# Altium footprint library connectors_socets.pcblib: 601 footprints (part 1 of 38)
Each footprint in its own frame and in the unit in brackets; x right, y up, seen from the top. Pads: shape width x height; smd on the part's side, far side on the other; paste and mask are expansions set on the pad; w line width, h text height; cw(c..) or ccw(c..) is an arc to the next point about the centre after c.
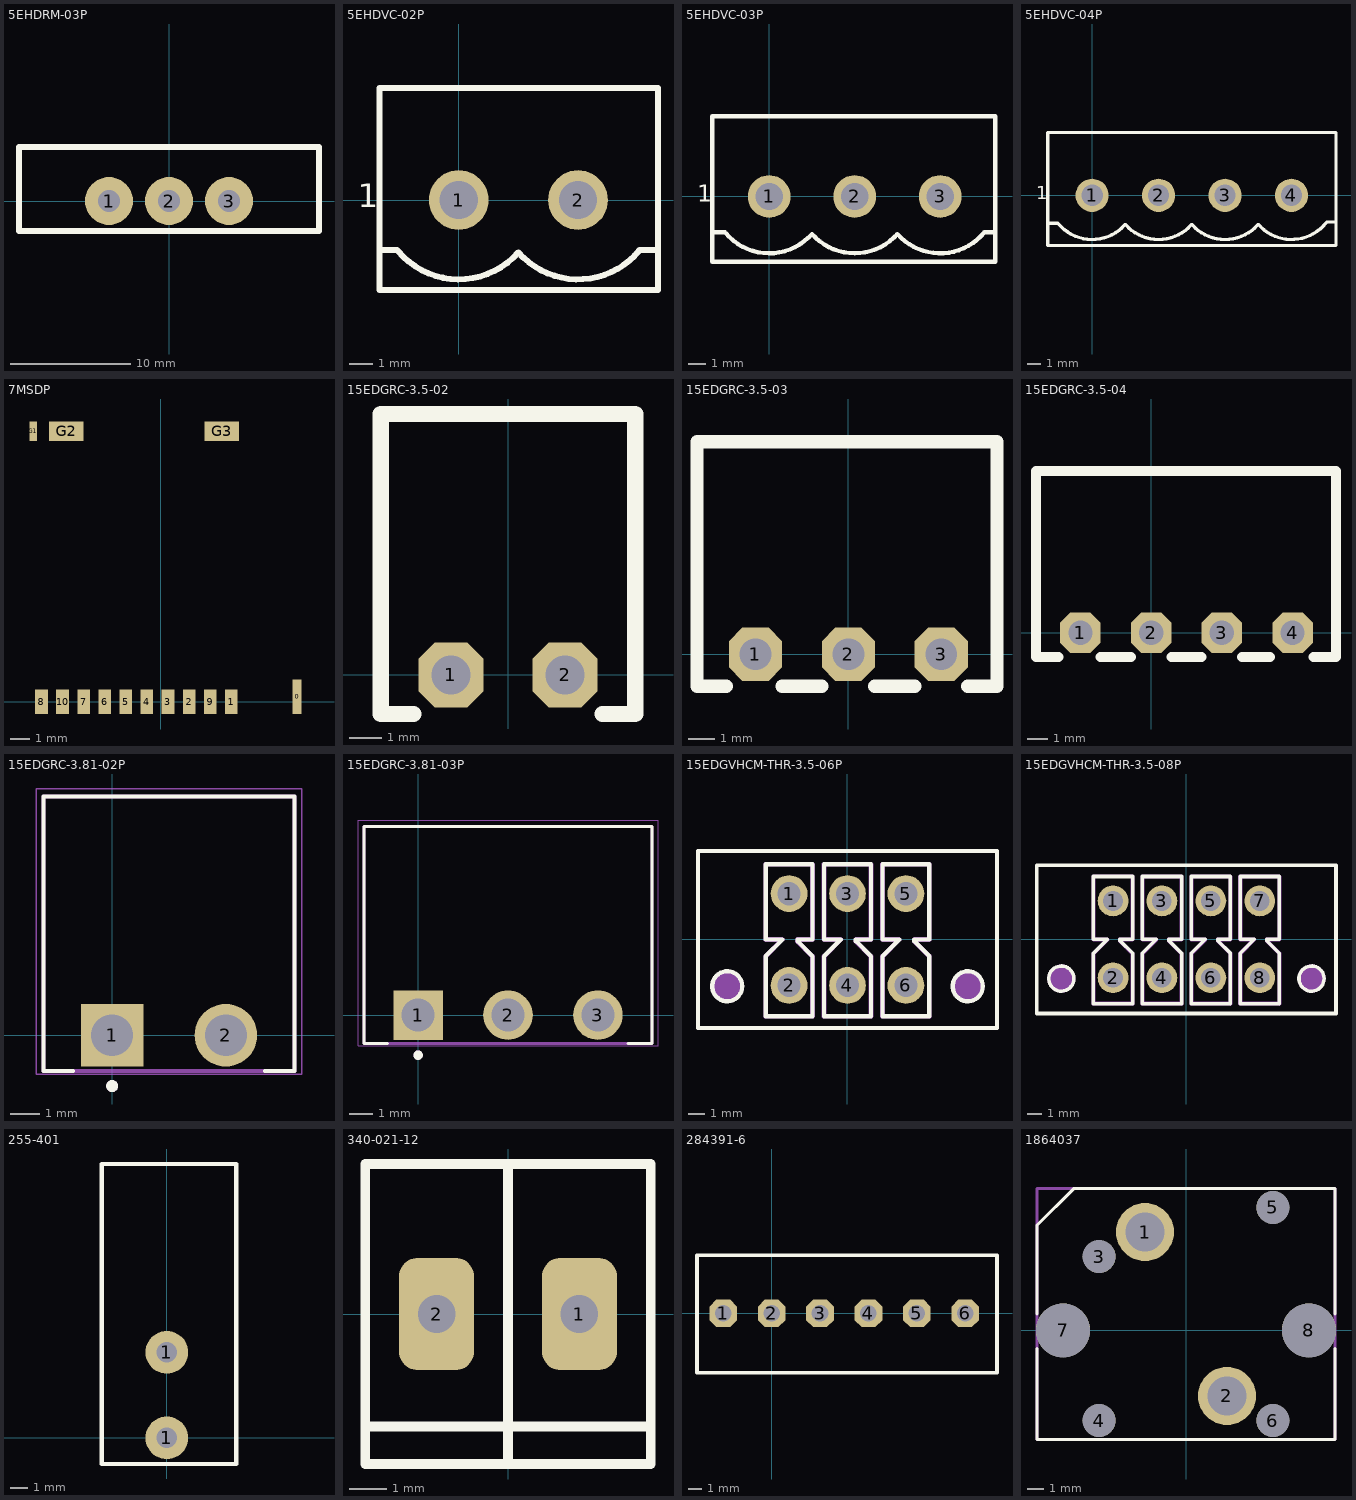
[diagram p0: the footprints below, top view; thin cyan lines are the x and y axes]

## 5EHDRM-03P [mm] "Connector 3Pin 5.00mm Pitch"
pads (3):
  round 4 hole 1.8: 1(-5,0) 2(0,0) 3(5,0)
Top Overlay:
  lines w0.5: -12.5,-2.5 0,-2.5 12.5,-2.5 12.5,3.5 12.5,4.5 -12.5,4.5 -12.5,3.5 -12.5,-2.5
3D body "terminal.stp": height 8.22, standoff -3.9, extent -12.525,-2.25 12.475,9.75

## 5EHDVC-02P [mm] "5mm 2 pins"
pads (2):
  round 2.5 hole 1.6: 1(0,0) 2(5,0)
Top Overlay:
  lines w0.254: -3.325,-2.101 -2.583,-2.101 ; -2.546,-2.139 ccw(c0,0) 2.5,-2.192 ccw(c5,0) 7.577,-2.101 8.35,-2.101 ; -3.325,-3.775 8.35,-3.775 8.35,4.7 -3.325,4.7 -3.325,-3.775
  text "1" at -4.223,-0.298 h1
3D body "5EHDVC-02P.stp": height 12.01, standoff -3.99, extent -3.3,-3.8 8.3,4.67

## 5EHDVC-03P [mm] "5mm 3 pins"
pads (3):
  round 2.5 hole 1.6: 1(0,0) 2(5,0) 3(10,0)
Top Overlay:
  lines w0.254: -3.325,-2.101 -2.583,-2.101 ; -2.546,-2.139 ccw(c0,0) 2.5,-2.192 ccw(c5,0) 7.5,-2.192 ccw(c10,0) 12.577,-2.101 13.225,-2.101 ; -3.325,-3.825 13.225,-3.825 13.225,4.7 -3.325,4.7 -3.325,-3.825
  text "1" at -4.223,-0.298 h1
3D body "5EHDVC-03P.stp": height 12.01, standoff -3.99, extent -3.325,-3.81 13.275,4.66

## 5EHDVC-04P [mm] "5mm 4 pins"
pads (4):
  round 2.5 hole 1.6: 1(0,0) 2(5,0) 3(10,0) 4(15,0)
Top Overlay:
  lines w0.254: -3.325,-2.101 -2.583,-2.101 ; -2.546,-2.139 ccw(c0,0) 2.5,-2.192 ccw(c5,0) 7.5,-2.192 ccw(c10,0) 12.5,-2.192 ccw(c15,0) 17.577,-2.101 ; 17.654,-2.011 18.302,-2.011 ; -3.325,-3.775 18.35,-3.775 18.35,4.725 -3.325,4.725 -3.325,-3.775
  text "1" at -4.223,-0.298 h1
3D body "5EHDVC-04P.stp": height 12.01, standoff -3.99, extent -3.275,-3.8 18.325,4.67

## 7MSDP [mm] "SD slot"
height 2.54
pads (14):
  rect 0.45x1.8 smd: 0(7.105,0.254)
  rect 0.66x1.27 smd: 1(3.675,0) 2(1.475,0) 3(0.375,0) 4(-0.725,0) 5(-1.825,0) 6(-2.925,0) 7(-4.025,0) 8(-6.225,0) 9(2.575,0) 10(-5.125,0)
  rect 0.4x1 smd: G1(-6.65,14.1)
  rect 1.8x1 smd: G2(-4.925,14.1) G3(3.175,14.1)
3D body "SD.stp": height 1.95, standoff 0, extent -7,-0.6 7.4,14.6

## 15EDGRC-3.5-02 [mm] "Connector 3.5mm pitch"
pads (2):
  oct 2x2 hole 1.2: 1(-1.75,0) 2(1.75,0)
Top Overlay:
  lines w0.5: -2.9,-1.2 -3.9,-1.2 -3.9,8 3.9,8 3.9,-1.2 2.9,-1.2
3D body "User Library-15EDGRC-3_5-2.step": height 7.2, standoff -3.4, extent -3.9,-1.2 3.9,8

## 15EDGRC-3.5-03 [mm] "Connector 3.5mm pitch"
pads (3):
  oct 2x2 hole 1.2: 1(-3.5,0) 2(0,0) 3(3.5,0)
Top Overlay:
  lines w0.5: -4.6,-1.2 -5.7,-1.2 -5.7,8 5.6,8 5.6,-1.2 4.5,-1.2 ; -2.5,-1.2 -1,-1.2 ; 1,-1.2 2.5,-1.2
3D body "User Library-15EDGRC-3_5-3.STEP": height 7.21, standoff -3.39, extent -5.65,-1.198 5.65,8.002

## 15EDGRC-3.5-04 [mm] "Connector 3.5mm pitch"
pads (4):
  oct 2x2 hole 1.2: 1(-3.5,0) 2(0,0) 3(3.5,0) 4(7,0)
Top Overlay:
  lines w0.5: -4.6,-1.2 -5.7,-1.2 -5.7,8 9.15,8 9.15,-1.2 8.05,-1.2 ; -2.5,-1.2 -1,-1.2 ; 1,-1.2 2.5,-1.2 ; 4.5,-1.2 5.875,-1.2
3D body "User Library-15EDGRC-3_5-3.STEP": height 2.8, standoff -7.8, extent -2.15,-1.2 9.15,8
3D body "User Library-15EDGRC-3_5-3.STEP": height 2.8, standoff -7.8, extent -5.65,-1.2 5.65,8

## 15EDGRC-3.81-02P [mm]
pads (2):
  rect 2.1x2.1 / inner round 2.1 / far side rect 2.1x2.1 hole 1.4: 1(0,0)
  round 2.1 hole 1.4: 2(3.81,0)
Top Overlay:
  circle w0.2: c0,-1.7 r0.1
  lines w0.127: -1.3,-1.2 -2.3,-1.2 -2.3,8 6.11,8 6.11,-1.2 5.11,-1.2
Plata3D:
  circle w0.2: c0,-1.7 r0.1
  lines w0.127: -2.3,-1.2 6.11,-1.2 6.11,8 -2.3,8 -2.3,-1.2
Board3D:
  lines w0.05: -2.55,-1.3 -2.55,8.25 6.36,8.25 6.36,-1.3 -2.55,-1.3
3D body "15EDGRC-3.81-02P-1Y-00A&Z(H).stp": height 7.29, standoff -3.35, extent -2.3,-1.27 6.11,7.93

## 15EDGRC-3.81-03P [mm]
pads (3):
  rect 2.1x2.1 / inner round 2.1 / far side rect 2.1x2.1 hole 1.4: 1(0,0)
  round 2.1 hole 1.4: 2(3.81,0) 3(7.62,0)
Top Overlay:
  circle w0.2: c0,-1.7 r0.1
  lines w0.127: -1.3,-1.2 -2.3,-1.2 -2.3,8 9.92,8 9.92,-1.2 ; 8.89,-1.2 9.89,-1.2
Plata3D:
  circle w0.2: c0,-1.7 r0.1
  lines w0.127: -2.3,-1.2 -2.3,8 9.92,8 9.92,-1.2 -2.3,-1.2
Board3D:
  lines w0.05: -2.55,-1.3 10.17,-1.3 10.17,8.25 -2.55,8.25 -2.55,-1.3
3D body "15EDGRC-3.81-03P-1Y-00A&Z(H).stp": height 7.29, standoff -3.35, extent -2.3,-1.25 9.92,7.95

## 15EDGVHCM-THR-3.5-06P [mm] "Connector LR"
pads (6):
  round 2.2 hole 1.4 paste-2539.97 mask+0.05: 1(-3.5,2.75) 3(0,2.75)
  round 2.2 hole 1.4 copper offset 0,0 paste-2539.97 mask+0.05: 2(-3.5,-2.75) 4(0,-2.75) 5(3.5,2.75) 6(3.5,-2.75)
Top Overlay:
  circle w0.254: c-7.2,-2.8 r0.9
  circle w0.254: c7.2,-2.8 r0.9
  lines w0.254: -4.9,4.5 -4.9,0 -3.9,0 -4.9,-1 -4.9,-4.6 -2.099,-4.601 -2.099,-0.999 -3.001,-0.1 -3.001,-0.001 -2.099,-0.001 -2.099,4.5 -2.201,4.5 -4.799,4.5 ; -1.4,4.5 -1.4,0 -0.4,0 -1.4,-1 -1.4,-4.6 1.401,-4.601 1.401,-0.999 0.499,-0.1 0.499,-0.001 1.401,-0.001 1.401,4.5 1.299,4.5 -1.299,4.5 ; 2.1,4.5 2.1,0 3.1,0 2.1,-1 2.1,-4.6 4.901,-4.601 4.901,-0.999 3.999,-0.1 3.999,-0.001 4.901,-0.001 4.901,4.5 4.799,4.5 2.201,4.5 ; -8.95,-5.3 8.95,-5.3 8.95,5.3 -8.95,5.3 -8.95,-5.3
Bot3D:
  drawing of 8 lines, arcs and shapes, not listed
Board3D:
  region: -8.89,5.3 -8.89,5.275 -8.925,5.24 -8.975,5.24 -9.01,5.275 -9.01,5.3 -9.01,5.325 -8.975,5.36 -8.925,5.36 -8.89,5.325
  region: -3.9,3.15 -3.1,3.15 -3.1,2.35 -3.9,2.35
  region: -3.9,-2.35 -3.1,-2.35 -3.1,-3.15 -3.9,-3.15
  region: -0.4,3.15 0.4,3.15 0.4,2.35 -0.4,2.35
  region: -0.4,-2.35 0.4,-2.35 0.4,-3.15 -0.4,-3.15
  region: 3.1,3.15 3.9,3.15 3.9,2.35 3.1,2.35
  region: 3.1,-2.35 3.9,-2.35 3.9,-3.15 3.1,-3.15
  lines w0.051: -8.95,-5.3 -8.95,5.3 8.95,5.3 8.95,-5.3 -8.95,-5.3
3D body "15EDGVHCM-THR-3.5-06P-1Y-1000Z(H)-PA.stp": height 11, standoff -1, extent -8.925,-5.25 8.975,5.35

## 15EDGVHCM-THR-3.5-08P [mm] "Connector LR"
pads (8):
  round 2.2 hole 1.4 paste-2539.97 mask+0.05: 1(-5.25,2.75) 3(-1.75,2.75) 7(5.25,2.75)
  round 2.2 hole 1.4 copper offset 0,0 paste-2539.97 mask+0.05: 2(-5.25,-2.75) 4(-1.75,-2.75) 5(1.75,2.75) 6(1.75,-2.75) 8(5.25,-2.75)
Top Overlay:
  circle w0.254: c-8.95,-2.8 r0.9
  circle w0.254: c8.95,-2.8 r0.9
  lines w0.254: -6.65,4.5 -6.65,0 -5.65,0 -6.65,-1 -6.65,-4.6 -3.849,-4.601 -3.849,-0.999 -4.751,-0.1 -4.751,-0.001 -3.849,-0.001 -3.849,4.5 -3.951,4.5 -6.549,4.5 ; -3.15,4.5 -3.15,0 -2.15,0 -3.15,-1 -3.15,-4.6 -0.349,-4.601 -0.349,-0.999 -1.251,-0.1 -1.251,-0.001 -0.349,-0.001 -0.349,4.5 -0.451,4.5 -3.049,4.5 ; 0.35,4.5 0.35,0 1.35,0 0.35,-1 0.35,-4.6 3.151,-4.601 3.151,-0.999 2.249,-0.1 2.249,-0.001 3.151,-0.001 3.151,4.5 3.049,4.5 0.451,4.5 ; 3.85,4.5 3.85,0 4.85,0 3.85,-1 3.85,-4.6 6.651,-4.601 6.651,-0.999 5.749,-0.1 5.749,-0.001 6.651,-0.001 6.651,4.5 6.549,4.5 3.951,4.5 ; -10.7,-5.3 10.7,-5.3 10.7,5.3 -10.7,5.3 -10.7,-5.3
Bot3D:
  drawing of 10 lines, arcs and shapes, not listed
Board3D:
  region: -10.64,5.3 -10.64,5.275 -10.675,5.24 -10.725,5.24 -10.76,5.275 -10.76,5.3 -10.76,5.325 -10.725,5.36 -10.675,5.36 -10.64,5.325
  region: -5.65,3.15 -4.85,3.15 -4.85,2.35 -5.65,2.35
  region: -5.65,-2.35 -4.85,-2.35 -4.85,-3.15 -5.65,-3.15
  region: -2.15,3.15 -1.35,3.15 -1.35,2.35 -2.15,2.35
  region: -2.15,-2.35 -1.35,-2.35 -1.35,-3.15 -2.15,-3.15
  region: 1.35,3.15 2.15,3.15 2.15,2.35 1.35,2.35
  region: 1.35,-2.35 2.15,-2.35 2.15,-3.15 1.35,-3.15
  region: 4.85,3.15 5.65,3.15 5.65,2.35 4.85,2.35
  region: 4.85,-2.35 5.65,-2.35 5.65,-3.15 4.85,-3.15
  lines w0.051: -10.7,-5.3 -10.7,5.3 10.7,5.3 10.7,-5.3 -10.7,-5.3
3D body "15EDGVHCM-THR-3.5-08P-1Y-1000Z(H)-PA.stp": height 10, standoff -2, extent -10.7,-5.3 10.7,5.3

## 255-401 [mm] "wago 1 pin"
pads (2):
  round 2.5 hole 1.2: 1(0,0) 1(0,5)
Top Overlay:
  lines w0.254: -3.81,-1.524 0,-1.524 4.064,-1.524 4.064,16.002 -3.81,16.002 -3.81,-1.524
3D body "255-401.stp": height 14.74, standoff -4, extent -3.675,-1.275 4.125,16.042

## 340-021-12 [mm]
pads (2):
  rrect50% 2x3 hole 1: 1(1.905,0) 2(-1.905,0)
Top Overlay:
  lines w0.254: -3.8,-3 3.8,-3 ; 0,-3.9 0,0 0,4 ; -3.81,-4 -3.81,0 -3.81,4 3.81,4 3.81,0 3.81,-4 -3.81,-4
3D body "User Library-ARK2_3v81.step": height 8.5, standoff -3.5, extent -4,-3.75 3.81,3.75

## 284391-6 [mm] "Connector 3.5mm pitch"
pads (6):
  oct 2x2 hole 1.2: 1(-3.5,0) 2(0,0) 3(3.5,0) 4(7,0) 5(10.5,0) 6(14,0)
Top Overlay:
  lines w0.254: -5.4,-4.3 16.3,-4.3 16.3,4.2 -5.2,4.2 -5.4,4.2 -5.4,-4.3
3D body "c-284391-6-b-3d.stp": height 12.7, standoff -3.4, extent -5.25,-4.1 16.25,4.1

## 1864037 [mm]
pads (8):
  round 3.55 hole 2.4: 1(-2.5,6) 2(2.5,-4)
  round 2 hole 2 unplated: 3(-5.3,4.5) 4(-5.3,-5.5) 5(5.3,7.5) 6(5.3,-5.5)
  round 3.3 hole 3.3 unplated: 7(-7.5,0) 8(7.5,0)
Top Overlay:
  lines w0.2: -9.09,-1.1 -9.09,-6.65 9.09,-6.65 9.09,-1.1 ; -9.09,1 -9.09,6.41 -6.85,8.65 9.09,8.65 9.09,1
Plata3D:
  lines w0.2: -9.09,-6.65 -9.09,8.65 9.09,8.65 9.09,-6.65 -9.09,-6.65
3D body "1864037.stp": height 16.2, standoff -5, extent -9.15,-6.65 9.15,8.65